# Altium footprint library MyPcbLib.PcbLib: 278 footprints (part 2 of 18)
Each footprint in its own frame and in the unit in brackets; x right, y up, seen from the top. Pads: shape width x height; smd on the part's side, far side on the other; paste and mask are expansions set on the pad; w line width, h text height; cw(c..) or ccw(c..) is an arc to the next point about the centre after c.
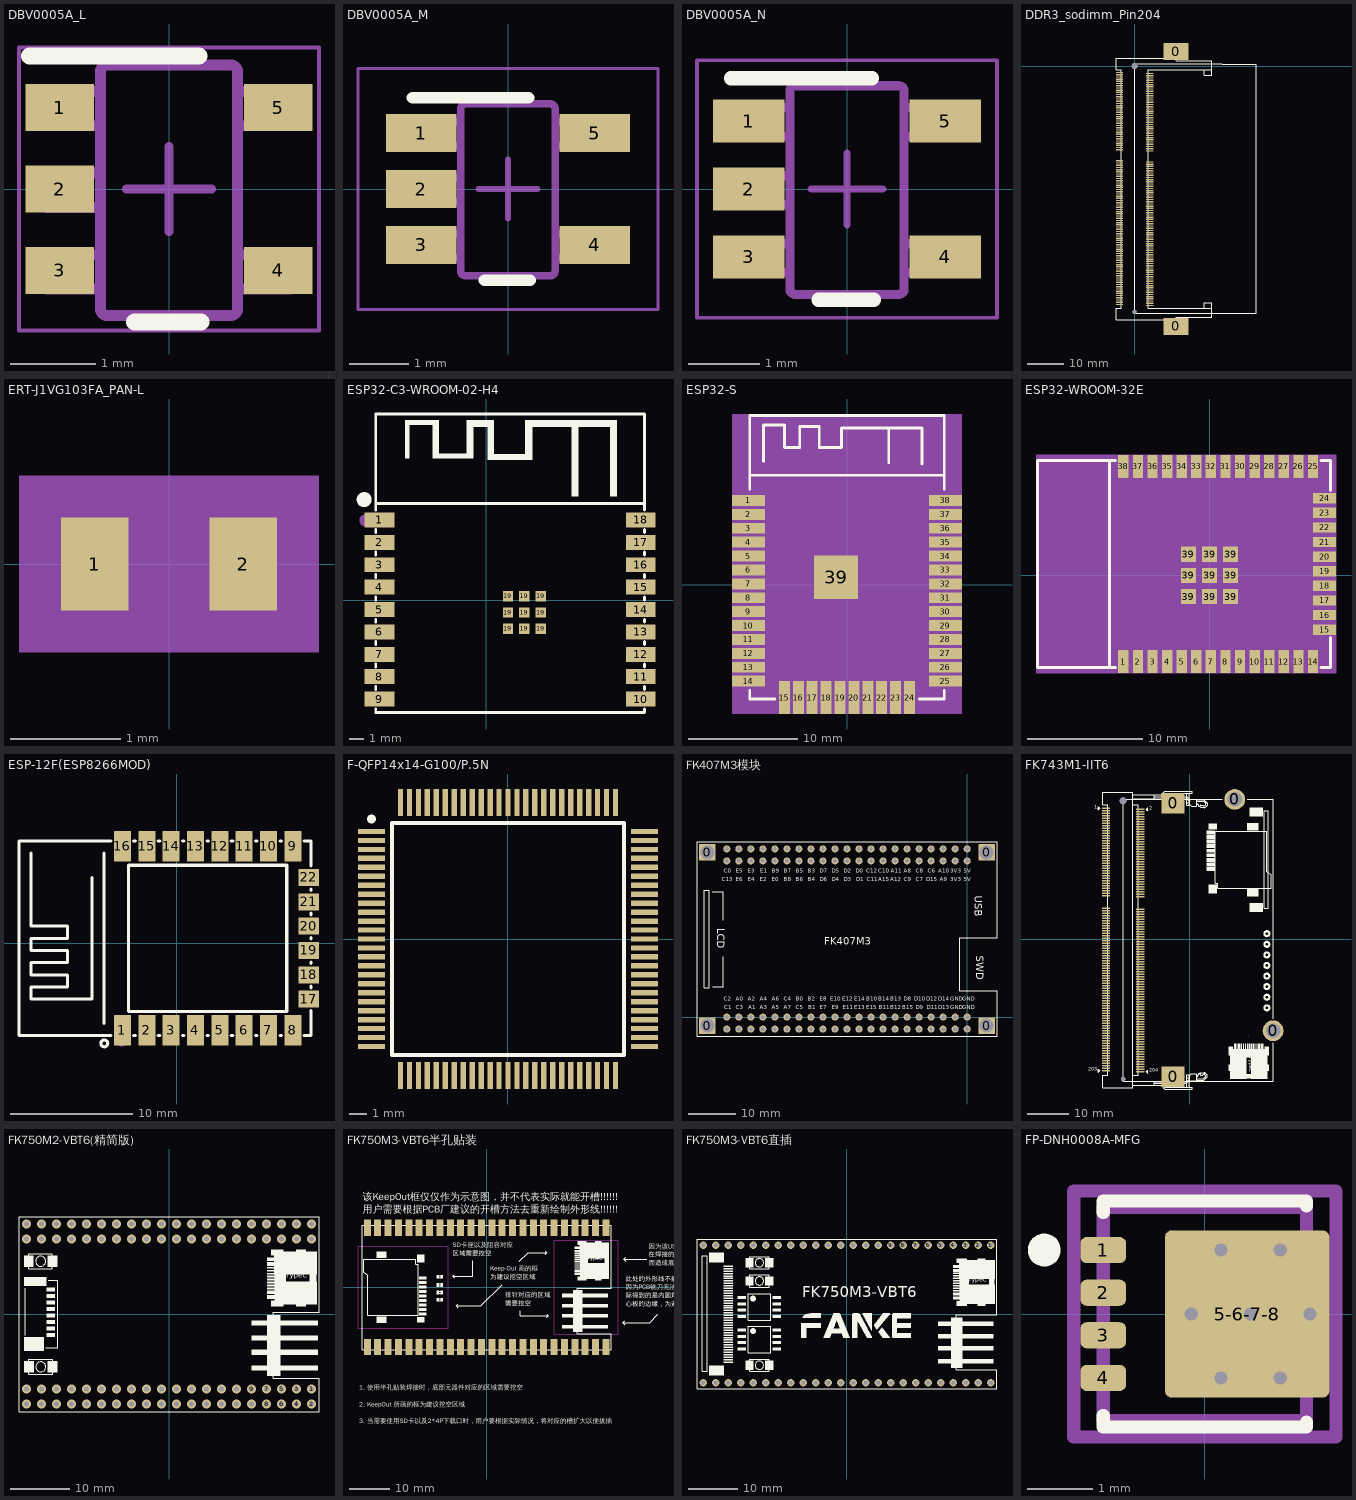
[diagram p1: the footprints below, top view; thin cyan lines are the x and y axes]

## DBV0005A_L [mm]
pads (5):
  rect 0.8x0.55 smd paste+0 mask+0.051: 1(-1.275,0.95) 2(-1.275,0) 3(-1.275,-0.95) 4(1.275,-0.95) 5(1.275,0.95)
Top Overlay:
  lines w0.2: -1.625,1.55 0.35,1.55 ; -0.4,-1.55 0.375,-1.55
Mechanical 13:
  lines w0.127: -0.801,1.371 cw(c-0.725,1.37) -0.725,1.446 ; -0.801,1.37 -0.801,1.371 ; -0.801,1.37 -0.801,-1.399 -0.801,-1.4 ccw(c-0.725,-1.399) -0.725,-1.475 ; -0.725,-1.475 0.723,-1.475 0.724,-1.475 ccw(c0.723,-1.399) 0.799,-1.4 0.799,-1.399 0.799,1.37 ; -0.725,-1.475 -0.725,-1.475 ; -0.725,1.446 -0.725,1.446 ; -0.725,1.446 0.723,1.446 0.724,1.446 cw(c0.723,1.37) 0.799,1.371 ; 0.799,1.37 0.799,1.371 ; -1.423,-1.167 -1.423,-0.767 -1.199,-0.767 -1.105,-0.767 -1.088,-0.767 -0.835,-0.767 -0.801,-0.767 -0.801,-1.167 -0.835,-1.167 -1.088,-1.167 -1.105,-1.167 -1.199,-1.167 -1.423,-1.167 ; -1.423,-0.215 -1.423,0.186 -1.199,0.186 -1.105,0.186 -1.088,0.186 -0.835,0.186 -0.801,0.186 -0.801,-0.215 -0.835,-0.215 -1.088,-0.215 -1.105,-0.215 -1.199,-0.215 -1.423,-0.215 ; -1.423,0.738 -1.423,1.138 -1.199,1.138 -1.105,1.138 -1.088,1.138 -0.835,1.138 -0.801,1.138 -0.801,0.738 -0.835,0.738 -1.088,0.738 -1.105,0.738 -1.199,0.738 -1.423,0.738 ; 0.799,-1.167 0.834,-1.167 1.087,-1.167 1.103,-1.167 1.198,-1.167 1.422,-1.167 1.422,-0.767 1.198,-0.767 1.103,-0.767 1.087,-0.767 0.834,-0.767 0.799,-0.767 0.799,-1.167 ; 0.799,0.738 0.834,0.738 1.087,0.738 1.103,0.738 1.198,0.738 1.422,0.738 1.422,1.138 1.198,1.138 1.103,1.138 1.087,1.138 0.834,1.138 0.799,1.138 0.799,0.738
  text ".Designator" at -0.885,0.95 h1.27
Mechanical 15:
  lines w0.05: -1.75,-1.65 1.75,-1.65 1.75,1.65 -1.75,1.65 -1.75,-1.65
  lines w0.1: -0.5,0 0.5,0 ; 0,-0.5 0,0.5
3D body: height 0.25, standoff 0, extent 0,0 0.254,0.254

## DBV0005A_M [mm]
pads (5):
  rect 1.2x0.65 smd paste+0 mask+0.051: 1(-1.475,0.95) 2(-1.475,0) 3(-1.475,-0.95) 4(1.475,-0.95) 5(1.475,0.95)
Top Overlay:
  lines w0.2: -1.625,1.55 0.35,1.55 ; -0.4,-1.55 0.375,-1.55
Mechanical 13:
  lines w0.127: -0.801,1.371 cw(c-0.725,1.37) -0.725,1.446 ; -0.801,1.37 -0.801,1.371 ; -0.801,1.37 -0.801,-1.399 -0.801,-1.4 ccw(c-0.725,-1.399) -0.725,-1.475 ; -0.725,-1.475 0.723,-1.475 0.724,-1.475 ccw(c0.723,-1.399) 0.799,-1.4 0.799,-1.399 0.799,1.37 ; -0.725,-1.475 -0.725,-1.475 ; -0.725,1.446 -0.725,1.446 ; -0.725,1.446 0.723,1.446 0.724,1.446 cw(c0.723,1.37) 0.799,1.371 ; 0.799,1.37 0.799,1.371 ; -1.423,-1.167 -1.423,-0.767 -1.199,-0.767 -1.105,-0.767 -1.088,-0.767 -0.835,-0.767 -0.801,-0.767 -0.801,-1.167 -0.835,-1.167 -1.088,-1.167 -1.105,-1.167 -1.199,-1.167 -1.423,-1.167 ; -1.423,-0.215 -1.423,0.186 -1.199,0.186 -1.105,0.186 -1.088,0.186 -0.835,0.186 -0.801,0.186 -0.801,-0.215 -0.835,-0.215 -1.088,-0.215 -1.105,-0.215 -1.199,-0.215 -1.423,-0.215 ; -1.423,0.738 -1.423,1.138 -1.199,1.138 -1.105,1.138 -1.088,1.138 -0.835,1.138 -0.801,1.138 -0.801,0.738 -0.835,0.738 -1.088,0.738 -1.105,0.738 -1.199,0.738 -1.423,0.738 ; 0.799,-1.167 0.834,-1.167 1.087,-1.167 1.103,-1.167 1.198,-1.167 1.422,-1.167 1.422,-0.767 1.198,-0.767 1.103,-0.767 1.087,-0.767 0.834,-0.767 0.799,-0.767 0.799,-1.167 ; 0.799,0.738 0.834,0.738 1.087,0.738 1.103,0.738 1.198,0.738 1.422,0.738 1.422,1.138 1.198,1.138 1.103,1.138 1.087,1.138 0.834,1.138 0.799,1.138 0.799,0.738
  text ".Designator" at -0.885,0.95 h1.27
Mechanical 15:
  lines w0.05: -2.55,-2.05 2.55,-2.05 2.55,2.05 -2.55,2.05 -2.55,-2.05
  lines w0.1: -0.5,0 0.5,0 ; 0,-0.5 0,0.5
3D body: height 0.25, standoff 0, extent 0,0 0.254,0.254

## DBV0005A_N [mm]
pads (5):
  rect 1x0.6 smd paste+0 mask+0.051: 1(-1.375,0.95) 2(-1.375,0) 3(-1.375,-0.95) 4(1.375,-0.95) 5(1.375,0.95)
Top Overlay:
  lines w0.2: -1.625,1.55 0.35,1.55 ; -0.4,-1.55 0.375,-1.55
Mechanical 13:
  lines w0.127: -0.801,1.371 cw(c-0.725,1.37) -0.725,1.446 ; -0.801,1.37 -0.801,1.371 ; -0.801,1.37 -0.801,-1.399 -0.801,-1.4 ccw(c-0.725,-1.399) -0.725,-1.475 ; -0.725,-1.475 0.723,-1.475 0.724,-1.475 ccw(c0.723,-1.399) 0.799,-1.4 0.799,-1.399 0.799,1.37 ; -0.725,-1.475 -0.725,-1.475 ; -0.725,1.446 -0.725,1.446 ; -0.725,1.446 0.723,1.446 0.724,1.446 cw(c0.723,1.37) 0.799,1.371 ; 0.799,1.37 0.799,1.371 ; -1.423,-1.167 -1.423,-0.767 -1.199,-0.767 -1.105,-0.767 -1.088,-0.767 -0.835,-0.767 -0.801,-0.767 -0.801,-1.167 -0.835,-1.167 -1.088,-1.167 -1.105,-1.167 -1.199,-1.167 -1.423,-1.167 ; -1.423,-0.215 -1.423,0.186 -1.199,0.186 -1.105,0.186 -1.088,0.186 -0.835,0.186 -0.801,0.186 -0.801,-0.215 -0.835,-0.215 -1.088,-0.215 -1.105,-0.215 -1.199,-0.215 -1.423,-0.215 ; -1.423,0.738 -1.423,1.138 -1.199,1.138 -1.105,1.138 -1.088,1.138 -0.835,1.138 -0.801,1.138 -0.801,0.738 -0.835,0.738 -1.088,0.738 -1.105,0.738 -1.199,0.738 -1.423,0.738 ; 0.799,-1.167 0.834,-1.167 1.087,-1.167 1.103,-1.167 1.198,-1.167 1.422,-1.167 1.422,-0.767 1.198,-0.767 1.103,-0.767 1.087,-0.767 0.834,-0.767 0.799,-0.767 0.799,-1.167 ; 0.799,0.738 0.834,0.738 1.087,0.738 1.103,0.738 1.198,0.738 1.422,0.738 1.422,1.138 1.198,1.138 1.103,1.138 1.087,1.138 0.834,1.138 0.799,1.138 0.799,0.738
  text ".Designator" at -0.885,0.95 h1.27
Mechanical 15:
  lines w0.05: -2.1,-1.8 -2.1,1.8 2.1,1.8 2.1,-1.8 -2.1,-1.8
  lines w0.1: -0.5,0 0.5,0 ; 0,-0.5 0,0.5
3D body: height 0.25, standoff 0, extent 0,0 0.254,0.254

## DDR3_sodimm_Pin204 [mm]
pads (208):
  round 1.1 hole 1.1 unplated: 0(0,-66.8)
  round 1.6 hole 1.6 unplated: 0(0,0)
  rect 6.8x4.7 smd: 0(11.3,-70.75) 0(11.3,3.95)
  rect 2x0.35 smd: 1(-4.1,-1.75) 2(4.1,-2.05) 3(-4.1,-2.35) 4(4.1,-2.65) 5(-4.1,-2.95) 6(4.1,-3.25) 7(-4.1,-3.55) 8(4.1,-3.85) 9(-4.1,-4.15) 10(4.1,-4.45) 11(-4.1,-4.75) 12(4.1,-5.05) 13(-4.1,-5.35) 14(4.1,-5.65) 15(-4.1,-5.95) 16(4.1,-6.25) 17(-4.1,-6.55) 18(4.1,-6.85) 19(-4.1,-7.15) 20(4.1,-7.45) 21(-4.1,-7.75) 22(4.1,-8.05) 23(-4.1,-8.35) 24(4.1,-8.65) 25(-4.1,-8.95) 26(4.1,-9.25) 27(-4.1,-9.55) 28(4.1,-9.85) 29(-4.1,-10.15) 30(4.1,-10.45) 31(-4.1,-10.75) 32(4.1,-11.05) 33(-4.1,-11.35) 34(4.1,-11.65) 35(-4.1,-11.95) 36(4.1,-12.25) 37(-4.1,-12.55) 38(4.1,-12.85) 39(-4.1,-13.15) 40(4.1,-13.45) 41(-4.1,-13.75) 42(4.1,-14.05) 43(-4.1,-14.35) 44(4.1,-14.65) 45(-4.1,-14.95) 46(4.1,-15.25) 47(-4.1,-15.55) 48(4.1,-15.85) 49(-4.1,-16.15) 50(4.1,-16.45) 51(-4.1,-16.75) 52(4.1,-17.05) 53(-4.1,-17.35) 54(4.1,-17.65) 55(-4.1,-17.95) 56(4.1,-18.25) 57(-4.1,-18.55) 58(4.1,-18.85) 59(-4.1,-19.15) 60(4.1,-19.45) 61(-4.1,-19.75) 62(4.1,-20.05) 63(-4.1,-20.35) 64(4.1,-20.65) 65(-4.1,-20.95) 66(4.1,-21.25) 67(-4.1,-21.55) 68(4.1,-21.85) 69(-4.1,-22.15) 70(4.1,-22.45) 71(-4.1,-22.75) 72(4.1,-23.05) 73(-4.1,-25.75) 74(4.1,-26.05) 75(-4.1,-26.35) 76(4.1,-26.65) 77(-4.1,-26.95) 78(4.1,-27.25) 79(-4.1,-27.55) 80(4.1,-27.85) 81(-4.1,-28.15) 82(4.1,-28.45) 83(-4.1,-28.75) 84(4.1,-29.05) 85(-4.1,-29.35) 86(4.1,-29.65) 87(-4.1,-29.95) 88(4.1,-30.25) 89(-4.1,-30.55) 90(4.1,-30.85) 91(-4.1,-31.15) 92(4.1,-31.45) 93(-4.1,-31.75) 94(4.1,-32.05) 95(-4.1,-32.35) 96(4.1,-32.65) 97(-4.1,-32.95) 98(4.1,-33.25) 99(-4.1,-33.55) 100(4.1,-33.85) 101(-4.1,-34.15) 102(4.1,-34.45) 103(-4.1,-34.75) 104(4.1,-35.05) 105(-4.1,-35.35) 106(4.1,-35.65) 107(-4.1,-35.95) 108(4.1,-36.25) 109(-4.1,-36.55) 110(4.1,-36.85) 111(-4.1,-37.15) 112(4.1,-37.45) 113(-4.1,-37.75) 114(4.1,-38.05) 115(-4.1,-38.35) 116(4.1,-38.65) 117(-4.1,-38.95) 118(4.1,-39.25) 119(-4.1,-39.55) 120(4.1,-39.85) 121(-4.1,-40.15) 122(4.1,-40.45) 123(-4.1,-40.75) 124(4.1,-41.05) 125(-4.1,-41.35) 126(4.1,-41.65) 127(-4.1,-41.95) 128(4.1,-42.25) 129(-4.1,-42.55) 130(4.1,-42.85) 131(-4.1,-43.15) 132(4.1,-43.45) 133(-4.1,-43.75) 134(4.1,-44.05) 135(-4.1,-44.35) 136(4.1,-44.65) 137(-4.1,-44.95) 138(4.1,-45.25) 139(-4.1,-45.55) 140(4.1,-45.85) 141(-4.1,-46.15) 142(4.1,-46.45) 143(-4.1,-46.75) 144(4.1,-47.05) 145(-4.1,-47.35) 146(4.1,-47.65) 147(-4.1,-47.95) 148(4.1,-48.25) 149(-4.1,-48.55) 150(4.1,-48.85) 151(-4.1,-49.15) 152(4.1,-49.45) 153(-4.1,-49.75) 154(4.1,-50.05) 155(-4.1,-50.35) 156(4.1,-50.65) 157(-4.1,-50.95) 158(4.1,-51.25) 159(-4.1,-51.55) 160(4.1,-51.85) 161(-4.1,-52.15) 162(4.1,-52.45) 163(-4.1,-52.75) 164(4.1,-53.05) 165(-4.1,-53.35) 166(4.1,-53.65) 167(-4.1,-53.95) 168(4.1,-54.25) 169(-4.1,-54.55) 170(4.1,-54.85) 171(-4.1,-55.15) 172(4.1,-55.45) 173(-4.1,-55.75) 174(4.1,-56.05) 175(-4.1,-56.35) 176(4.1,-56.65) 177(-4.1,-56.95) 178(4.1,-57.25) 179(-4.1,-57.55) 180(4.1,-57.85) 181(-4.1,-58.15) 182(4.1,-58.45) 183(-4.1,-58.75) 184(4.1,-59.05) 185(-4.1,-59.35) 186(4.1,-59.65) 187(-4.1,-59.95) 188(4.1,-60.25) 189(-4.1,-60.55) 190(4.1,-60.85) 191(-4.1,-61.15) 192(4.1,-61.45) 193(-4.1,-61.75) 194(4.1,-62.05) 195(-4.1,-62.35) 196(4.1,-62.65) 197(-4.1,-62.95) 198(4.1,-63.25) 199(-4.1,-63.55) 200(4.1,-63.85) 201(-4.1,-64.15) 202(4.1,-64.45) 203(-4.1,-64.75) 204(4.1,-65.05)
Top Overlay:
  lines w0.15: 20.9,-65.75 18.9,-65.75 18.9,-64.35 20.9,-64.35 20.9,-65.75 ; 20.9,-65.75 20.9,-68.25 11.3,-68.25 11.3,-68.95 -5,-68.95 -5,-65.75 -3.7,-65.75 -3.7,-1.05 -5,-1.05 -5,2.15 11.3,2.15 11.3,1.45 20.9,1.45 20.9,-1.05 ; 20.9,-65.75 3.7,-65.75 3.7,-1.05 20.9,-1.05 ; 20.9,-1.05 20.9,-2.45 18.9,-2.45 18.9,-1.05 20.9,-1.05
  lines w0.152: 23.825,0.566 0,0.566 0,-67.1 33.013,-67.1 33.013,0.553 23.838,0.553

## ERT-J1VG103FA_PAN-L [mil]
pads (2):
  rect 24x33 smd paste+0 mask+0: 1(-26.5,0) 2(26.5,0)
Mechanical 5:
  region: 53.5,-31.5 -53.5,-31.5 -53.5,31.5 53.5,31.5
Mechanical 13:
  lines w1: -34.5,-17.5 -34.5,17.5 ; -34.5,-17.5 -14.5,-17.5 -14.5,17.5 -34.5,17.5 ; -34.5,-17.5 34.5,-17.5 ; -34.5,-17.5 -34.5,17.5 ; -34.5,17.5 34.5,17.5 ; 34.5,-17.5 14.5,-17.5 14.5,17.5 34.5,17.5 ; 34.5,-17.5 34.5,17.5 ; 34.5,-17.5 34.5,17.5
Mechanical 15:
  region: 42.5,-20.5 -42.5,-20.5 -42.5,20.5 42.5,20.5
  lines w6: -42.5,-20.5 -42.5,20.5 42.5,20.5 42.5,-20.5 -42.5,-20.5
3D body "ERT-J1VG103FA_PAN.step": height 35, standoff 0, extent -34.49,-17.48 34.49,17.48

## ESP32-C3-WROOM-02-H4 [mm]
pads (27):
  rect 2x1 smd: 1(-7.149,5.38) 2(-7.149,3.88) 3(-7.149,2.38) 4(-7.149,0.88) 5(-7.149,-0.62) 6(-7.149,-2.12) 7(-7.149,-3.62) 8(-7.149,-5.12) 9(-7.149,-6.62) 10(10.351,-6.62) 11(10.351,-5.12) 12(10.351,-3.62) 13(10.351,-2.12) 14(10.351,-0.62) 15(10.351,0.88) 16(10.351,2.38) 17(10.351,3.88) 18(10.351,5.38)
  rect 0.7x0.7 smd: 19(1.461,-1.92) 19(1.461,-0.82) 19(1.461,0.28) 19(2.561,-1.92) 19(2.561,-0.82) 19(2.561,0.28) 19(3.661,-1.92) 19(3.661,-0.82) 19(3.661,0.28)
Top Overlay:
  circle w0.5: c-8.178,6.746 r0.25
  region: -4.969,12.065 -3.191,12.065 -3.191,9.815 -1.286,9.815 -1.286,12.065 0.492,12.065 0.492,9.797 2.632,9.797 2.632,12.047 8.747,12.047 8.747,6.985 8.311,6.985 8.311,11.612 6.17,11.612 6.17,6.967 5.717,6.967 5.717,11.612 3.086,11.612 3.086,9.398 0.092,9.398 0.092,11.63 -0.851,11.63 -0.851,9.507 -3.591,9.507 -3.591,11.775 -5.151,11.775 -5.151,9.507 -5.423,9.507 -5.423,12.047
  lines w0.2: -7.399,-7.274 -7.399,-7.52 10.601,-7.52 10.601,-7.274 ; -7.399,-5.966 -7.399,-5.774 ; -7.399,-4.466 -7.399,-4.274 ; -7.399,-2.966 -7.399,-2.774 ; -7.399,-1.466 -7.399,-1.274 ; -7.399,0.034 -7.399,0.226 ; -7.399,1.534 -7.399,1.726 ; -7.399,3.034 -7.399,3.226 ; -7.399,4.534 -7.399,4.726 ; -7.399,6.034 -7.399,12.48 10.601,12.48 10.601,6.034 ; -7.399,6.48 10.601,6.48 ; 10.601,-5.966 10.601,-5.774 ; 10.601,-4.466 10.601,-4.274 ; 10.601,-2.966 10.601,-2.774 ; 10.601,-1.466 10.601,-1.274 ; 10.601,0.034 10.601,0.226 ; 10.601,1.534 10.601,1.726 ; 10.601,3.034 10.601,3.226 ; 10.601,4.534 10.601,4.726
Mechanical 15:
  circle w0.4: c-8.097,5.351 r0.2

## ESP32-S [mm]
pads (39):
  rect 3x1 smd: 1(-9.041,7.699) 2(-9.041,6.429) 3(-9.041,5.159) 4(-9.041,3.889) 5(-9.041,2.619) 6(-9.041,1.349) 7(-9.041,0.079) 8(-9.041,-1.191) 9(-9.041,-2.461) 10(-9.041,-3.731) 11(-9.041,-5.001) 12(-9.041,-6.271) 13(-9.041,-7.541) 14(-9.041,-8.811) 25(8.959,-8.811) 26(8.959,-7.541) 27(8.959,-6.271) 28(8.959,-5.001) 29(8.959,-3.731) 30(8.959,-2.461) 31(8.959,-1.191) 32(8.959,0.079) 33(8.959,1.349) 34(8.959,2.619) 35(8.959,3.889) 36(8.959,5.159) 37(8.959,6.429) 38(8.959,7.699)
  rect 1x3 smd: 15(-5.756,-10.311) 16(-4.486,-10.311) 17(-3.216,-10.311) 18(-1.946,-10.311) 19(-0.676,-10.311) 20(0.594,-10.311) 21(1.864,-10.311) 22(3.134,-10.311) 23(4.404,-10.311) 24(5.674,-10.311)
  rect 4x4 smd: 39(-1.041,0.689)
Top Overlay:
  lines w0.254: -8.931,-9.676 -8.931,-10.438 -6.645,-10.438 ; -8.931,8.739 -8.931,15.47 8.849,15.47 8.849,8.739 ; -8.931,10.009 8.849,10.009 ; -7.661,11.278 -7.661,14.58 -5.756,14.58 -5.756,12.548 -4.359,12.548 -4.359,14.453 -2.581,14.453 -2.581,12.548 -0.549,12.548 -0.549,14.326 6.817,14.326 6.817,11.024 ; 3.769,11.152 3.769,14.327 ; 6.563,-10.438 8.849,-10.438 8.849,-9.676
Mechanical 4:
  region: -10.541,15.597 10.465,15.597 10.465,-11.811 -10.541,-11.811
Mechanical 5:
  drawing of 39 lines, arcs and shapes, not listed

## ESP32-WROOM-32E [mm]
pads (47):
  rect 0.9x2 smd: 1(-7.512,-7.5) 2(-6.242,-7.5) 3(-4.972,-7.5) 4(-3.702,-7.5) 5(-2.432,-7.5) 6(-1.162,-7.5) 7(0.108,-7.5) 8(1.378,-7.5) 9(2.648,-7.5) 10(3.918,-7.5) 11(5.188,-7.5) 12(6.458,-7.5) 13(7.728,-7.5) 14(8.998,-7.5) 25(8.998,9.5) 26(7.728,9.5) 27(6.458,9.5) 28(5.188,9.5) 29(3.918,9.5) 30(2.648,9.5) 31(1.378,9.5) 32(0.108,9.5) 33(-1.162,9.5) 34(-2.432,9.5) 35(-3.702,9.5) 36(-4.972,9.5) 37(-6.242,9.5) 38(-7.512,9.5)
  rect 2x0.9 smd: 15(9.998,-4.715) 16(9.998,-3.445) 17(9.998,-2.175) 18(9.998,-0.905) 19(9.998,0.365) 20(9.998,1.635) 21(9.998,2.905) 22(9.998,4.175) 23(9.998,5.445) 24(9.998,6.715)
  rect 1.33x1.33 smd: 39(-1.847,-1.835) 39(-1.847,0) 39(-1.847,1.835) 39(-0.012,-1.835) 39(-0.012,0) 39(-0.012,1.835) 39(1.823,-1.835) 39(1.823,0) 39(1.823,1.835)
Top Overlay:
  lines w0.254: -8.702,10 -8.702,-8 -8.193,-8 ; -8.702,10.017 -8.193,10.017 ; -8.536,-8 -14.986,-8 -14.986,10 -8.52,10 ; 9.679,-8 10.514,-8 10.514,-5.396 ; 9.679,10.017 10.514,10.017 10.514,7.396
Mechanical 4:
  region: -15.113,-8.509 -15.113,10.5 10.998,10.5 10.998,-8.509
Mechanical 5:
  drawing of 47 lines, arcs and shapes, not listed
Mechanical 15:
  lines w0.003: -2.083,1.45 -2.032,1.501

## ESP-12F(ESP8266MOD) [mm]
pads (22):
  rect 1.4x2.5 smd: 1(-4.454,-7.141) 2(-2.454,-7.141) 3(-0.454,-7.141) 4(1.546,-7.141) 5(3.546,-7.141) 6(5.546,-7.141) 7(7.546,-7.141) 8(9.546,-7.14) 9(9.546,7.96) 10(7.546,7.961) 11(5.546,7.962) 12(3.546,7.962) 13(1.546,7.961) 14(-0.454,7.962) 15(-2.454,7.961) 16(-4.454,7.962)
  rect 1.7x1.4 smd: 17(10.847,-4.589) 18(10.846,-2.591) 19(10.846,-0.592) 20(10.846,1.409) 21(10.846,3.408) 22(10.847,5.408)
Top Overlay:
  circle w0.254: c-5.947,-8.225 r0.284
  lines w0.254: -12.954,-7.591 -12.954,8.409 -5.385,8.409 ; -12.954,-7.59 -5.385,-7.59 ; -11.954,7.409 -11.954,1.409 -8.954,1.409 -8.954,0.409 -11.954,0.409 -11.954,-0.591 -8.954,-0.591 -8.954,-1.591 -11.954,-1.591 -11.954,-2.591 -8.954,-2.591 -8.954,-3.591 -11.954,-3.591 -11.954,-4.591 -6.954,-4.591 -6.954,5.409 ; -5.954,-6.591 -5.954,7.409 ; -3.523,-7.59 -3.385,-7.59 ; -3.523,8.409 -3.385,8.409 ; -1.523,-7.59 -1.385,-7.59 ; -1.523,8.409 -1.385,8.409 ; 0.477,-7.59 0.615,-7.59 ; 0.477,8.409 0.615,8.409 ; 2.477,-7.59 2.615,-7.59 ; 2.477,8.409 2.615,8.409 ; 4.477,-7.59 4.615,-7.59 ; 4.477,8.409 4.615,8.409 ; 6.477,-7.59 6.615,-7.59 ; 6.477,8.409 6.615,8.409 ; 8.477,-7.59 8.615,-7.59 ; 8.477,8.409 8.615,8.409 ; 10.477,-7.59 11.044,-7.59 11.044,-5.52 ; 10.477,8.409 11.044,8.409 11.044,6.339 ; 11.044,-3.658 11.044,-3.522 ; 11.044,-1.66 11.044,-1.523 ; 11.044,0.339 11.044,0.477 ; 11.044,2.34 11.044,2.477 ; 11.044,4.339 11.044,4.477 ; -3.954,-5.591 9.046,-5.591 9.046,6.409 -3.954,6.409 -3.954,-5.591
Mechanical 15:
  circle w0.5: c-4.55,-7.971 r0.25

## F-QFP14x14-G100/P.5N [mm] "QFP; 100 Leads; Body 14 x 14 mm; Pitch 0.5 mm"
height 1.7
pads (100):
  rect 1.5x0.3 smd: 1(-7.625,6) 2(-7.625,5.5) 3(-7.625,5) 4(-7.625,4.5) 5(-7.625,4) 6(-7.625,3.5) 7(-7.625,3) 8(-7.625,2.5) 9(-7.625,2) 10(-7.625,1.5) 11(-7.625,1) 12(-7.625,0.5) 13(-7.625,0) 14(-7.625,-0.5) 15(-7.625,-1) 16(-7.625,-1.5) 17(-7.625,-2) 18(-7.625,-2.5) 19(-7.625,-3) 20(-7.625,-3.5) 21(-7.625,-4) 22(-7.625,-4.5) 23(-7.625,-5) 24(-7.625,-5.5) 25(-7.625,-6) 51(7.625,-6) 52(7.625,-5.5) 53(7.625,-5) 54(7.625,-4.5) 55(7.625,-4) 56(7.625,-3.5) 57(7.625,-3) 58(7.625,-2.5) 59(7.625,-2) 60(7.625,-1.5) 61(7.625,-1) 62(7.625,-0.5) 63(7.625,0) 64(7.625,0.5) 65(7.625,1) 66(7.625,1.5) 67(7.625,2) 68(7.625,2.5) 69(7.625,3) 70(7.625,3.5) 71(7.625,4) 72(7.625,4.5) 73(7.625,5) 74(7.625,5.5) 75(7.625,6)
  rect 0.3x1.5 smd: 26(-6,-7.625) 27(-5.5,-7.625) 28(-5,-7.625) 29(-4.5,-7.625) 30(-4,-7.625) 31(-3.5,-7.625) 32(-3,-7.625) 33(-2.5,-7.625) 34(-2,-7.625) 35(-1.5,-7.625) 36(-1,-7.625) 37(-0.5,-7.625) 38(0,-7.625) 39(0.5,-7.625) 40(1,-7.625) 41(1.5,-7.625) 42(2,-7.625) 43(2.5,-7.625) 44(3,-7.625) 45(3.5,-7.625) 46(4,-7.625) 47(4.5,-7.625) 48(5,-7.625) 49(5.5,-7.625) 50(6,-7.625) 76(6,7.625) 77(5.5,7.625) 78(5,7.625) 79(4.5,7.625) 80(4,7.625) 81(3.5,7.625) 82(3,7.625) 83(2.5,7.625) 84(2,7.625) 85(1.5,7.625) 86(1,7.625) 87(0.5,7.625) 88(0,7.625) 89(-0.5,7.625) 90(-1,7.625) 91(-1.5,7.625) 92(-2,7.625) 93(-2.5,7.625) 94(-3,7.625) 95(-3.5,7.625) 96(-4,7.625) 97(-4.5,7.625) 98(-5,7.625) 99(-5.5,7.625) 100(-6,7.625)
Top Overlay:
  circle w0.25: c-7.625,6.7 r0.125
  lines w0.2: -6.475,-6.475 6.475,-6.475 6.475,6.475 -6.475,6.475 -6.475,-6.475
3D body "stm32h750vbt6.x_t": height 1.48, standoff 0, extent -8.002,-7.998 7.998,8.002

## FK407M3模块 [mm]
pads (88):
  rect 3.5x3.5 hole 3: 0(-54.887,-1.8) 0(-54.887,34.82) 0(4.093,-1.8) 0(4.093,34.82)
  round 1.5 hole 0.9: 1(0,35.56) 2(0,33.02) 3(-2.54,35.56) 4(-2.54,33.02) 5(-5.08,35.56) 6(-5.08,33.02) 7(-7.62,35.56) 8(-7.62,33.02) 9(-10.16,35.56) 10(-10.16,33.02) 11(-12.7,35.56) 12(-12.7,33.02) 13(-15.24,35.56) 14(-15.24,33.02) 15(-17.78,35.56) 16(-17.78,33.02) 17(-20.32,35.56) 18(-20.32,33.02) 19(-22.86,35.56) 20(-22.86,33.02) 21(-25.4,35.56) 22(-25.4,33.02) 23(-27.94,35.56) 24(-27.94,33.02) 25(-30.48,35.56) 26(-30.48,33.02) 27(-33.02,35.56) 28(-33.02,33.02) 29(-35.56,35.56) 30(-35.56,33.02) 31(-38.1,35.56) 32(-38.1,33.02) 33(-40.64,35.56) 34(-40.64,33.02) 35(-43.18,35.56) 36(-43.18,33.02) 37(-45.72,35.56) 38(-45.72,33.02) 39(-48.26,35.56) 40(-48.26,33.02) 41(-50.8,35.56) 42(-50.8,33.02) 43(0,0) 44(0,-2.54) 45(-2.54,0) 46(-2.54,-2.54) 47(-5.08,0) 48(-5.08,-2.54) 49(-7.62,0) 50(-7.62,-2.54) 51(-10.16,0) 52(-10.16,-2.54) 53(-12.7,0) 54(-12.7,-2.54) 55(-15.24,0) 56(-15.24,-2.54) 57(-17.78,0) 58(-17.78,-2.54) 59(-20.32,0) 60(-20.32,-2.54) 61(-22.86,0) 62(-22.86,-2.54) 63(-25.4,0) 64(-25.4,-2.54) 65(-27.94,0) 66(-27.94,-2.54) 67(-30.48,0) 68(-30.48,-2.54) 69(-33.02,0) 70(-33.02,-2.54) 71(-35.56,0) 72(-35.56,-2.54) 73(-38.1,0) 74(-38.1,-2.54) 75(-40.64,0) 76(-40.64,-2.54) 77(-43.18,0) 78(-43.18,-2.54) 79(-45.72,0) 80(-45.72,-2.54) 81(-48.26,0) 82(-48.26,-2.54) 83(-50.8,0) 84(-50.8,-2.54)
Top Overlay:
  lines w0.254: -53.871,26.518 -51.585,26.518 -51.585,20.422 ; -53.744,6.452 -51.585,6.452 -51.585,12.802 ; -57.097,-4.01 -57.097,37.03 6.303,37.03 6.303,16.793 -1.591,16.793 -1.591,5.593 6.303,5.593 6.303,-4.01 -57.097,-4.01 ; -55.564,6.183 -54.548,6.183 -54.548,26.802 -55.564,26.802 -55.564,6.183
  text "USB" at 1.628,25.629 h1.52
  text "5V" at -0.677,30.556 h0.81
  text "3V3" at -3.623,30.556 h0.81
  text "A10" at -6.096,30.556 h0.81
  text "C6" at -8.297,30.556 h0.81
  text "C8" at -10.837,30.556 h0.81
  text "A8" at -13.377,30.556 h0.81
  text "A11" at -16.12,30.556 h0.81
  text "C10" at -18.796,30.556 h0.81
  text "C12" at -21.336,30.556 h0.81
  text "D0" at -23.537,30.556 h0.81
  text "D2" at -26.077,30.556 h0.81
  text "D5" at -28.617,30.556 h0.81
  text "D7" at -31.157,30.556 h0.81
  text "B3" at -33.697,30.556 h0.81
  text "B5" at -36.237,30.556 h0.81
  text "B7" at -38.777,30.556 h0.81
  text "B9" at -41.317,30.556 h0.81
  text "E1" at -43.722,30.556 h0.81
  text "E3" at -46.397,30.556 h0.81
  text "E5" at -48.937,30.556 h0.81
  text "C0" at -51.477,30.556 h0.81
  text "C13" at -51.816,28.727 h0.81
  text "E6" at -48.937,28.727 h0.81
  text "E4" at -46.397,28.727 h0.81
  text "E2" at -43.857,28.727 h0.81
  text "E0" at -41.317,28.727 h0.81
  text "B8" at -38.777,28.727 h0.81
  text "B6" at -36.237,28.727 h0.81
  text "B4" at -33.697,28.727 h0.81
  text "D6" at -31.157,28.727 h0.81
  text "D4" at -28.617,28.727 h0.81
  text "D3" at -26.077,28.727 h0.81
  text "D1" at -23.402,28.727 h0.81
  text "C11" at -21.2,28.727 h0.81
  text "A15" at -18.796,28.727 h0.81
  text "A12" at -16.256,28.727 h0.81
  text "C9" at -13.377,28.727 h0.81
  text "C7" at -10.837,28.727 h0.81
  text "D15" at -8.636,28.727 h0.81
  text "A9" at -5.757,28.727 h0.81
  text "3V3" at -3.623,28.727 h0.81
  text "5V" at -0.677,28.727 h0.81
  text "GND" at -1.083,3.48 h0.81
  text "GND" at -3.623,3.48 h0.81
  text "D14" at -6.096,3.48 h0.81
  text "D12" at -8.636,3.48 h0.81
  text "D10" at -11.176,3.48 h0.81
  text "D8" at -13.377,3.48 h0.81
  text "B13" at -16.256,3.48 h0.81
  text "B14" at -18.796,3.48 h0.81
  text "B10" at -21.336,3.48 h0.81
  text "E14" at -23.876,3.48 h0.81
  text "E12" at -26.416,3.48 h0.81
  text "E10" at -28.956,3.48 h0.81
  text "E8" at -31.157,3.48 h0.81
  text "B2" at -33.697,3.48 h0.81
  text "B0" at -36.237,3.48 h0.81
  text "C4" at -38.777,3.48 h0.81
  text "A6" at -41.317,3.48 h0.81
  text "A4" at -43.857,3.48 h0.81
  text "A2" at -46.397,3.48 h0.81
  text "A0" at -48.937,3.48 h0.81
  text "C2" at -51.477,3.48 h0.81
  text "C1" at -51.342,1.666 h0.81
  text "C3" at -48.937,1.666 h0.81
  text "A1" at -46.262,1.666 h0.81
  text "A3" at -43.857,1.666 h0.81
  text "A5" at -41.317,1.666 h0.81
  text "A7" at -38.777,1.666 h0.81
  text "C5" at -36.237,1.666 h0.81
  text "B1" at -33.562,1.666 h0.81
  text "E7" at -31.157,1.666 h0.81
  text "E9" at -28.617,1.666 h0.81
  text "E11" at -26.28,1.666 h0.81
  text "E13" at -23.876,1.666 h0.81
  text "E15" at -21.336,1.666 h0.81
  text "B11" at -18.66,1.666 h0.81
  text "B12" at -16.256,1.666 h0.81
  text "B15" at -13.716,1.666 h0.81
  text "D9" at -10.837,1.666 h0.81
  text "D11" at -8.5,1.666 h0.81
  text "D13" at -6.096,1.666 h0.81
  text "GND" at -3.623,1.666 h0.81
  text "GND" at -1.083,1.666 h0.81
  text "SWD" at 1.882,12.929 h1.52
  text "LCD" at -52.855,18.771 h1.52
  text "FK407M3" at -30.249,15.342 h1.52

## FK743M1-IIT6 [mm]
pads (210):
  round 1.1 hole 1.1 unplated: 0(-15.951,-33.569)
  round 1.6 hole 1.6 unplated: 0(-15.951,33.231)
  rect 5.5x5 smd: 0(-3.951,-32.969) 0(-3.951,32.631)
  round 5 hole 3.5: 0(10.852,33.569) 0(20.052,-21.931)
  rect 2x0.35 smd: 1(-20.052,31.481) 2(-11.851,31.181) 3(-20.052,30.881) 4(-11.851,30.581) 5(-20.052,30.281) 6(-11.851,29.981) 7(-20.052,29.681) 8(-11.851,29.381) 9(-20.052,29.081) 10(-11.851,28.781) 11(-20.052,28.481) 12(-11.851,28.181) 13(-20.052,27.881) 14(-11.851,27.581) 15(-20.052,27.281) 16(-11.851,26.981) 17(-20.052,26.681) 18(-11.851,26.381) 19(-20.052,26.081) 20(-11.851,25.781) 21(-20.052,25.481) 22(-11.851,25.181) 23(-20.052,24.881) 24(-11.851,24.581) 25(-20.052,24.281) 26(-11.851,23.981) 27(-20.052,23.681) 28(-11.851,23.381) 29(-20.052,23.081) 30(-11.851,22.781) 31(-20.052,22.481) 32(-11.851,22.181) 33(-20.052,21.881) 34(-11.851,21.581) 35(-20.052,21.281) 36(-11.851,20.981) 37(-20.052,20.681) 38(-11.851,20.381) 39(-20.052,20.081) 40(-11.851,19.781) 41(-20.052,19.481) 42(-11.851,19.181) 43(-20.052,18.881) 44(-11.851,18.581) 45(-20.052,18.281) 46(-11.851,17.981) 47(-20.052,17.681) 48(-11.851,17.381) 49(-20.052,17.081) 50(-11.851,16.781) 51(-20.052,16.481) 52(-11.851,16.181) 53(-20.052,15.881) 54(-11.851,15.581) 55(-20.052,15.281) 56(-11.851,14.981) 57(-20.052,14.681) 58(-11.851,14.381) 59(-20.052,14.081) 60(-11.851,13.781) 61(-20.052,13.481) 62(-11.851,13.181) 63(-20.052,12.881) 64(-11.851,12.581) 65(-20.052,12.281) 66(-11.851,11.981) 67(-20.052,11.681) 68(-11.851,11.381) 69(-20.052,11.081) 70(-11.851,10.781) 71(-20.052,10.481) 72(-11.851,10.181) 73(-20.052,7.481) 74(-11.851,7.181) 75(-20.052,6.881) 76(-11.851,6.581) 77(-20.052,6.281) 78(-11.851,5.981) 79(-20.052,5.681) 80(-11.851,5.381) 81(-20.052,5.081) 82(-11.851,4.781) 83(-20.052,4.481) 84(-11.851,4.181) 85(-20.052,3.881) 86(-11.851,3.581) 87(-20.052,3.281) 88(-11.851,2.981) 89(-20.052,2.681) 90(-11.851,2.381) 91(-20.052,2.081) 92(-11.851,1.781) 93(-20.052,1.481) 94(-11.851,1.181) 95(-20.052,0.881) 96(-11.851,0.581) 97(-20.052,0.281) 98(-11.851,-0.019) 99(-20.052,-0.319) 100(-11.851,-0.619) 101(-20.052,-0.919) 102(-11.851,-1.219) 103(-20.052,-1.519) 104(-11.851,-1.819) 105(-20.052,-2.119) 106(-11.851,-2.419) 107(-20.052,-2.719) 108(-11.851,-3.019) 109(-20.052,-3.319) 110(-11.851,-3.619) 111(-20.052,-3.919) 112(-11.851,-4.219) 113(-20.052,-4.519) 114(-11.851,-4.819) 115(-20.052,-5.119) 116(-11.851,-5.419) 117(-20.052,-5.719) 118(-11.851,-6.019) 119(-20.052,-6.319) 120(-11.851,-6.619) 121(-20.052,-6.919) 122(-11.851,-7.219) 123(-20.052,-7.519) 124(-11.851,-7.819) 125(-20.052,-8.119) 126(-11.851,-8.419) 127(-20.052,-8.719) 128(-11.851,-9.019) 129(-20.052,-9.319) 130(-11.851,-9.619) 131(-20.052,-9.919) 132(-11.851,-10.219) 133(-20.052,-10.519) 134(-11.851,-10.819) 135(-20.052,-11.119) 136(-11.851,-11.419) 137(-20.052,-11.719) 138(-11.851,-12.019) 139(-20.052,-12.319) 140(-11.851,-12.619) 141(-20.052,-12.919) 142(-11.851,-13.219) 143(-20.052,-13.519) 144(-11.851,-13.819) 145(-20.052,-14.119) 146(-11.851,-14.419) 147(-20.052,-14.719) 148(-11.851,-15.019) 149(-20.052,-15.319) 150(-11.851,-15.619) 151(-20.052,-15.919) 152(-11.851,-16.219) 153(-20.052,-16.519) 154(-11.851,-16.819) 155(-20.052,-17.119) 156(-11.851,-17.419) 157(-20.052,-17.719) 158(-11.851,-18.019) 159(-20.052,-18.319) 160(-11.851,-18.619) 161(-20.052,-18.919) 162(-11.851,-19.219) 163(-20.052,-19.519) 164(-11.851,-19.819) 165(-20.052,-20.119) 166(-11.851,-20.419) 167(-20.052,-20.719) 168(-11.851,-21.019) 169(-20.052,-21.319) 170(-11.851,-21.619) 171(-20.052,-21.919) 172(-11.851,-22.219) 173(-20.052,-22.519) 174(-11.851,-22.819) 175(-20.052,-23.119) 176(-11.851,-23.419) 177(-20.052,-23.719) 178(-11.851,-24.019) 179(-20.052,-24.319) 180(-11.851,-24.619) 181(-20.052,-24.919) 182(-11.851,-25.219) 183(-20.052,-25.519) 184(-11.851,-25.819) 185(-20.052,-26.119) 186(-11.851,-26.419) 187(-20.052,-26.719) 188(-11.851,-27.019) 189(-20.052,-27.319) 190(-11.851,-27.619) 191(-20.052,-27.919) 192(-11.851,-28.219) 193(-20.052,-28.519) 194(-11.851,-28.819) 195(-20.052,-29.119) 196(-11.851,-29.419) 197(-20.052,-29.719) 198(-11.851,-30.019) 199(-20.052,-30.319) 200(-11.851,-30.619) 201(-20.052,-30.919) 202(-11.851,-31.219) 203(-20.052,-31.519) 204(-11.851,-31.819)
Top Overlay:
  drawing of 259 lines, arcs and shapes, not listed
  text "204" at -9.691,-32.183 h1.52
  text "203" at -24.258,-31.929 h1.52
  text "2" at -9.615,30.769 h1.52
  text "1" at -22.822,31.01 h1.52
  text "TypeC" at 13.92,-28.189 h1.52
3D body "FK743M1-IIT6-V1.0.step": height 7.16, standoff 0.93, extent -15.964,-34.039 20.036,33.561
3D body "DDR3 SODIMM-204Pin.STEP": height 5.65, standoff -0.5, extent -20.969,-35.967 5.571,35.633

## FK750M2-VBT6(精简版) [mm]
pads (80):
  round 1.5 hole 0.9: 1(24.13,-12.7) 2(24.13,-15.24) 3(21.59,-12.7) 4(21.59,-15.24) 5(19.05,-12.7) 6(19.05,-15.24) 7(16.51,-12.7) 8(16.51,-15.24) 9(13.97,-12.7) 10(13.97,-15.24) 11(11.43,-12.7) 12(11.43,-15.24) 13(8.89,-12.7) 14(8.89,-15.24) 15(6.35,-12.7) 16(6.35,-15.24) 17(3.81,-12.7) 18(3.81,-15.24) 19(1.27,-12.7) 20(1.27,-15.24) 21(-1.27,-12.7) 22(-1.27,-15.24) 23(-3.81,-12.7) 24(-3.81,-15.24) 25(-6.35,-12.7) 26(-6.35,-15.24) 27(-8.89,-12.7) 28(-8.89,-15.24) 29(-11.43,-12.7) 30(-11.43,-15.24) 31(-13.97,-12.7) 32(-13.97,-15.24) 33(-16.51,-12.7) 34(-16.51,-15.24) 35(-19.05,-12.7) 36(-19.05,-15.24) 37(-21.59,-12.7) 38(-21.59,-15.24) 39(-24.13,-12.7) 40(-24.13,-15.24) 41(24.13,15.24) 42(24.13,12.7) 43(21.59,15.24) 44(21.59,12.7) 45(19.05,15.24) 46(19.05,12.7) 47(16.51,15.24) 48(16.51,12.7) 49(13.97,15.24) 50(13.97,12.7) 51(11.43,15.24) 52(11.43,12.7) 53(8.89,15.24) 54(8.89,12.7) 55(6.35,15.24) 56(6.35,12.7) 57(3.81,15.24) 58(3.81,12.7) 59(1.27,15.24) 60(1.27,12.7) 61(-1.27,15.24) 62(-1.27,12.7) 63(-3.81,15.24) 64(-3.81,12.7) 65(-6.35,15.24) 66(-6.35,12.7) 67(-8.89,15.24) 68(-8.89,12.7) 69(-11.43,15.24) 70(-11.43,12.7) 71(-13.97,15.24) 72(-13.97,12.7) 73(-16.51,15.24) 74(-16.51,12.7) 75(-19.05,15.24) 76(-19.05,12.7) 77(-21.59,15.24) 78(-21.59,12.7) 79(-24.13,15.24) 80(-24.13,12.7)
Top Overlay:
  circle w0.15: c-21.721,-8.946 r0.85
  circle w0.15: c-21.733,8.936 r0.85
  rectangle: -24.545,-9.912 -22.894,-7.994
  rectangle: -20.545,-9.899 -18.894,-7.994
  rectangle: -24.558,7.969 -22.907,9.887
  rectangle: -20.557,7.982 -18.906,9.887
  rectangle: -24.536,4.756 -20.777,6.254
  rectangle: -24.536,-6.268 -21.17,-3.906
  rectangle: -20.777,2.698 -19.265,3.409
  rectangle: -20.777,0.501 -19.265,1.2
  rectangle: -20.777,-1.696 -19.278,-0.998
  rectangle: -20.777,-3.893 -19.265,-3.195
  rectangle: -20.777,3.803 -19.265,4.502
  rectangle: -20.777,1.593 -19.265,2.304
  rectangle: -20.777,-0.604 -19.278,0.107
  rectangle: -20.777,-2.801 -19.265,-2.09
  rectangle: 17.285,9.924 19.419,10.915
  rectangle: 21.54,9.928 23.165,10.915
  rectangle: 17.285,1.238 19.419,2.266
  rectangle: 21.54,1.238 23.165,2.368
  rectangle: 23.826,5.225 24.956,6.978
  rectangle: 17.831,5.352 19.825,6.978
  rectangle: 17.831,1.619 25.045,5.543
  rectangle: 17.819,6.673 25.045,10.559
  rectangle: 16.561,4.171 17.857,4.476
  rectangle: 16.561,4.667 17.857,4.971
  rectangle: 16.561,5.175 17.857,5.479
  rectangle: 16.561,5.67 17.857,5.975
  rectangle: 16.561,6.178 17.857,6.483
  rectangle: 16.561,6.673 17.857,6.978
  rectangle: 16.561,7.169 17.857,7.473
  rectangle: 16.561,7.677 17.857,7.981
  rectangle: 16.561,2.558 17.908,3.181
  rectangle: 16.561,3.359 17.908,3.981
  rectangle: 16.561,8.159 17.908,8.781
  rectangle: 16.561,8.947 17.958,9.582
  rectangle: 13.958,-9.595 25.261,-8.706
  rectangle: 13.958,-6.928 25.261,-6.039
  rectangle: 13.958,-4.515 25.261,-3.626
  rectangle: 13.958,-1.975 25.261,-1.086
  rectangle: 16.625,-10.484 18.911,-0.197
  lines w0.1: -24.321,-3.576 -24.321,4.324 ; -20.848,-5.698 -18.843,-5.698 -18.843,5.696 -20.448,5.696
  lines w0.127: -23.733,7.686 -23.733,10.186 -19.733,10.186 -19.733,7.686 -23.733,7.686 ; -23.721,-10.196 -23.721,-7.696 -19.721,-7.696 -19.721,-10.196 -23.721,-10.196
  lines w0.152: -25.4,-16.51 25.4,-16.51 25.4,-10.847 17.632,-10.847 17.632,0.329 25.4,0.329 25.4,16.51 -25.4,16.51 -25.4,-16.51
  text "TypeC" at 19.698,5.809 h1.52
3D body "FK750M2-VBT6-V1.0.step": height 8.36, standoff 1.86, extent -25.4,-16.51 25.4,16.51

## FK750M3-VBT6半孔贴装 [mm]
pads (48):
  rect 1.7x4 smd: 1(29.21,14.605) 2(26.67,14.605) 3(24.13,14.605) 4(21.59,14.605) 5(19.05,14.605) 6(16.51,14.605) 7(13.97,14.605) 8(11.43,14.605) 9(8.89,14.605) 10(6.35,14.605) 11(3.81,14.605) 12(1.27,14.605) 13(-1.27,14.605) 14(-3.81,14.605) 15(-6.35,14.605) 16(-8.89,14.605) 17(-11.43,14.605) 18(-13.97,14.605) 19(-16.51,14.605) 20(-19.05,14.605) 21(-21.59,14.605) 22(-24.13,14.605) 23(-26.67,14.605) 24(-29.21,14.605) 25(29.21,-14.605) 26(26.67,-14.605) 27(24.13,-14.605) 28(21.59,-14.605) 29(19.05,-14.605) 30(16.51,-14.605) 31(13.97,-14.605) 32(11.43,-14.605) 33(8.89,-14.605) 34(6.35,-14.605) 35(3.81,-14.605) 36(1.27,-14.605) 37(-1.27,-14.605) 38(-3.81,-14.605) 39(-6.35,-14.605) 40(-8.89,-14.605) 41(-11.43,-14.605) 42(-13.97,-14.605) 43(-16.51,-14.605) 44(-19.05,-14.605) 45(-21.59,-14.605) 46(-24.13,-14.605) 47(-26.67,-14.605) 48(-29.21,-14.605)
Top Overlay:
  region: -14.694,1.491 -16.51,1.491 -16.51,0.792 -14.694,0.792
  region: -15.215,7.988 -17.005,7.988 -17.005,6.096 -15.215,6.096
  region: -14.694,-2.909 -16.51,-2.909 -16.51,-3.608 -14.694,-3.608
  region: -14.694,-0.709 -16.51,-0.709 -16.51,-1.408 -14.694,-1.408
  region: -14.694,2.591 -16.51,2.591 -16.51,1.892 -14.694,1.892
  region: -14.694,0.391 -16.51,0.391 -16.51,-0.308 -14.694,-0.308
  region: -14.694,-1.809 -16.51,-1.809 -16.51,-2.508 -14.694,-2.508
  region: -14.694,-4.009 -16.51,-4.009 -16.51,-4.708 -14.694,-4.708
  region: -14.694,-6.209 -16.51,-6.209 -16.51,-6.908 -14.694,-6.908
  region: -14.694,-5.109 -16.51,-5.109 -16.51,-5.808 -14.694,-5.808
  region: -15.202,-7.302 -17.005,-7.302 -17.005,-8.611 -15.202,-8.611
  region: -11.684,3.048 -12.319,3.048 -12.319,2.159 -11.684,2.159
  region: -11.671,-0.826 -12.306,-0.826 -12.306,-1.714 -11.671,-1.714
  region: -11.684,-2.616 -12.319,-2.616 -12.319,-3.505 -11.684,-3.505
  region: -11.684,1.003 -12.319,1.003 -12.319,0.114 -11.684,0.114
  region: -24.46,8.738 -26.949,8.738 -26.949,7.15 -24.46,7.15
  region: -24.46,-7.163 -26.949,-7.163 -26.949,-8.738 -24.46,-8.738
  region: -10.668,3.048 -11.303,3.048 -11.303,2.159 -10.668,2.159
  region: -10.655,-0.826 -11.29,-0.826 -11.29,-1.714 -10.655,-1.714
  region: -10.668,-2.616 -11.303,-2.616 -11.303,-3.505 -10.668,-3.505
  region: -10.668,1.003 -11.303,1.003 -11.303,0.114 -10.668,0.114
  rectangle: 18.466,-10.065 29.769,-9.176
  rectangle: 18.466,-7.398 29.769,-6.509
  rectangle: 18.466,-4.985 29.769,-4.096
  rectangle: 18.466,-2.445 29.769,-1.556
  rectangle: 21.133,-10.954 23.419,-0.667
  rectangle: 26.518,10.342 28.143,11.328
  rectangle: 21.539,9.36 22.936,9.995
  rectangle: 21.539,8.572 22.885,9.195
  rectangle: 21.539,3.772 22.885,4.394
  rectangle: 21.539,2.972 22.885,3.594
  rectangle: 21.539,8.09 22.835,8.395
  rectangle: 21.539,7.582 22.835,7.887
  rectangle: 21.539,7.087 22.835,7.391
  rectangle: 21.539,6.591 22.835,6.896
  rectangle: 21.539,6.083 22.835,6.388
  rectangle: 21.539,5.588 22.835,5.893
  rectangle: 21.539,5.08 22.835,5.385
  rectangle: 21.539,4.585 22.835,4.889
  rectangle: 28.804,5.639 29.934,7.391
  rectangle: 26.518,1.651 28.143,2.781
  rectangle: 22.263,1.651 24.397,2.68
  rectangle: 22.263,10.338 24.397,11.328
  rectangle: 22.809,5.766 24.803,7.391
  rectangle: 22.797,7.087 30.023,10.973
  rectangle: 22.809,2.032 30.023,5.956
  lines w0.102: -11.611,-3.284 -11.383,-3.284 ; -11.611,-2.776 -11.383,-2.776 ; -11.611,0.335 -11.383,0.335 ; -11.611,0.843 -11.383,0.843 ; -11.611,2.38 -11.383,2.38 ; -11.611,2.888 -11.383,2.888 ; -11.598,-1.494 -11.37,-1.494 ; -11.598,-0.986 -11.37,-0.986
  lines w0.127: -7.874,2.286 -8.255,2.667 ; -7.874,3.048 -8.255,2.667 ; -3.429,6.477 -3.429,2.667 -8.255,2.667 ; 8.255,-5.715 8.255,-6.985 15.113,-6.985 ; 14.732,-7.366 15.113,-6.985 ; 14.732,-6.604 15.113,-6.985
  lines w0.152: -7.112,-4.953 -7.493,-4.572 ; -7.112,-4.191 -7.493,-4.572 ; 3.81,0.635 -1.397,-4.572 -7.493,-4.572 ; 8.001,6.35 10.16,8.509 14.732,8.509 ; 14.351,8.128 14.732,8.509 ; 14.351,8.89 14.732,8.509 ; 33.598,6.858 34.11,7.37 ; 33.782,-9.144 33.294,-8.656 33.294,-8.616 ; 33.782,-8.128 33.294,-8.616 ; 34.11,6.354 33.606,6.858 39.243,6.858 ; 41.963,-6.608 39.955,-8.616 33.274,-8.616 33.294,-8.616 ; -30.48,-15.24 30.48,-15.24 30.48,-11.358 22.216,-11.358 22.216,-0.182 30.48,-0.182 30.48,15.24 -30.48,15.24 -30.48,-15.24 ; -30.48,-15.24 -30.48,-15.24 ; -30.125,3.647 -30.125,6.847 -17.704,6.847 -17.323,6.847 -17.323,5.704 -16.688,5.704 -16.688,5.069 -16.688,-6.412 -16.688,-6.869 -29.058,-6.869 -29.058,2.91 -30.125,3.647 ; 30.55,6.731 30.558,6.731 30.55,6.731
  text "因为该USB端子的固定引脚是直插的， / 在焊接的时候，可能会因为锡渗入底部 / 而造成底部不平整，所以建议挖空" at 39.677,4.949 h2.03
  text "此处的外形线不能贴着核心板的边线， / 因为PCB铣刀无法加工出内直角，实 / 际得到的是内圆角，加上排针临近核 / 心板的边缘，为避免干涉，需要当拉宽" at 34.089,-5.084 h2.03
  text "1. 使用半孔贴装焊接时，底部元器件对应的区域需要挖空 /  / 2. KeepOut 所画的框为建议挖空区域 /  / 3. 当需要使用SD卡以及2*4P下载口时，用户要根据实际情况，将对应的槽扩大以便拔插" at -31.242,-33.742 h2.03
  text "该KeepOut框仅仅作为示意图，并不代表实际就能开槽!!!!!! / 用户需要根据PCB厂建议的开槽方法去重新绘制外形线!!!!!!" at -30.353,17.629 h3.05
  text "Keep-Out 画的框 / 为建议挖空区域" at 0.889,1.524 h2.03
  text "排针对应的区域 / 需要挖空" at 4.572,-4.953 h2.03
  text "TypeC" at 24.676,6.223 h1.52
  text "SD卡座以及阻容对应 / 区域需要挖空" at -8.255,7.239 h2.03
Keep-Out Layer:
  lines w0.152: -31.496,-10.033 -9.398,-10.033 -9.398,10.033 -31.496,10.033 -31.496,-10.033
  lines w0.203: 16.51,-11.43 32.258,-11.43 32.258,11.557 16.51,11.557 16.51,-11.43
3D body "FK750M3-VBT6-V1.0.step": height 3.86, standoff -2.64, extent -30.48,-15.24 30.48,15.24

## FK750M3-VBT6直插 [mm]
pads (48):
  round 1.5 hole 0.9: 1(29.21,13.97) 2(26.67,13.97) 3(24.13,13.97) 4(21.59,13.97) 5(19.05,13.97) 6(16.51,13.97) 7(13.97,13.97) 8(11.43,13.97) 9(8.89,13.97) 10(6.35,13.97) 11(3.81,13.97) 12(1.27,13.97) 13(-1.27,13.97) 14(-3.81,13.97) 15(-6.35,13.97) 16(-8.89,13.97) 17(-11.43,13.97) 18(-13.97,13.97) 19(-16.51,13.97) 20(-19.05,13.97) 21(-21.59,13.97) 22(-24.13,13.97) 23(-26.67,13.97) 24(-29.21,13.97) 25(29.21,-13.97) 26(26.67,-13.97) 27(24.13,-13.97) 28(21.59,-13.97) 29(19.05,-13.97) 30(16.51,-13.97) 31(13.97,-13.97) 32(11.43,-13.97) 33(8.89,-13.97) 34(6.35,-13.97) 35(3.81,-13.97) 36(1.27,-13.97) 37(-1.27,-13.97) 38(-3.81,-13.97) 39(-6.35,-13.97) 40(-8.89,-13.97) 41(-11.43,-13.97) 42(-13.97,-13.97) 43(-16.51,-13.97) 44(-19.05,-13.97) 45(-21.59,-13.97) 46(-24.13,-13.97) 47(-26.67,-13.97) 48(-29.21,-13.97)
Top Overlay:
  drawing of 913 lines, arcs and shapes, not listed
  text "TypeC" at 24.676,6.223 h1.52
  text "FK750M3-VBT6" at -9.068,2.553 h3.81
3D body "FK750M3-VBT6-V1.0排针.step": height 14.36, standoff 0.26, extent -30.48,-15.24 30.48,15.24

## FP-DNH0008A-MFG [mm]
height 16.9
pads (5):
  rrect50% 0.7x0.4 smd paste-1000 mask-1000: 1(-1.55,0.975) 2(-1.55,0.325) 3(-1.55,-0.325) 4(-1.55,-0.975)
  rrect8% 2.51x2.55 smd paste-1000 mask-1000: 5-6-7-8(0.645,0)
via 1.603,0 diameter 0.5 hole 0.2
via 0.698,0 diameter 0.5 hole 0.2
via 1.15,0.975 diameter 0.5 hole 0.2
via 1.15,-0.975 diameter 0.5 hole 0.2
via 0.245,-0.975 diameter 0.5 hole 0.2
via 0.245,0.975 diameter 0.5 hole 0.2
via -0.207,0 diameter 0.5 hole 0.2
Top Overlay:
  circle w0.25: c-2.45,0.975 r0.125
  lines w0.2: -1.55,-1.55 -1.55,-1.725 1.55,-1.725 1.55,-1.65 ; -1.55,1.55 -1.55,1.725 1.55,1.725 1.55,1.65
Top Paste:
  drawing of 12 lines, arcs and shapes, not listed
Top Solder:
  drawing of 5 lines, arcs and shapes, not listed
Top 3D Body:
  lines w0.2: -1.55,-1.625 -1.55,1.625 1.55,1.625 1.55,-1.625 -1.55,-1.625
Top Component Center:
  lines w0.1: -0.5,0 0.5,0 ; 0,-0.5 0,0.5
Top Courtyard:
  lines w0.2: -2,-1.875 -2,1.875 2,1.875 2,-1.875 -2,-1.875
Top Assembly:
  lines w0.2: -2,-1.875 -2,1.875 2,1.875 2,-1.875 -2,-1.875
3D body "Trans_Texas_Instruments_CSD18543Q3AT_eec.STEP": height 0.9, standoff 0, extent -1.65,-1.655 1.65,1.655